# Altium footprint library 二极管封装库.PcbLib: 222 footprints (part 11 of 14)
Each footprint in its own frame and in the unit in brackets; x right, y up, seen from the top. Pads: shape width x height; smd on the part's side, far side on the other; paste and mask are expansions set on the pad; w line width, h text height; cw(c..) or ccw(c..) is an arc to the next point about the centre after c.
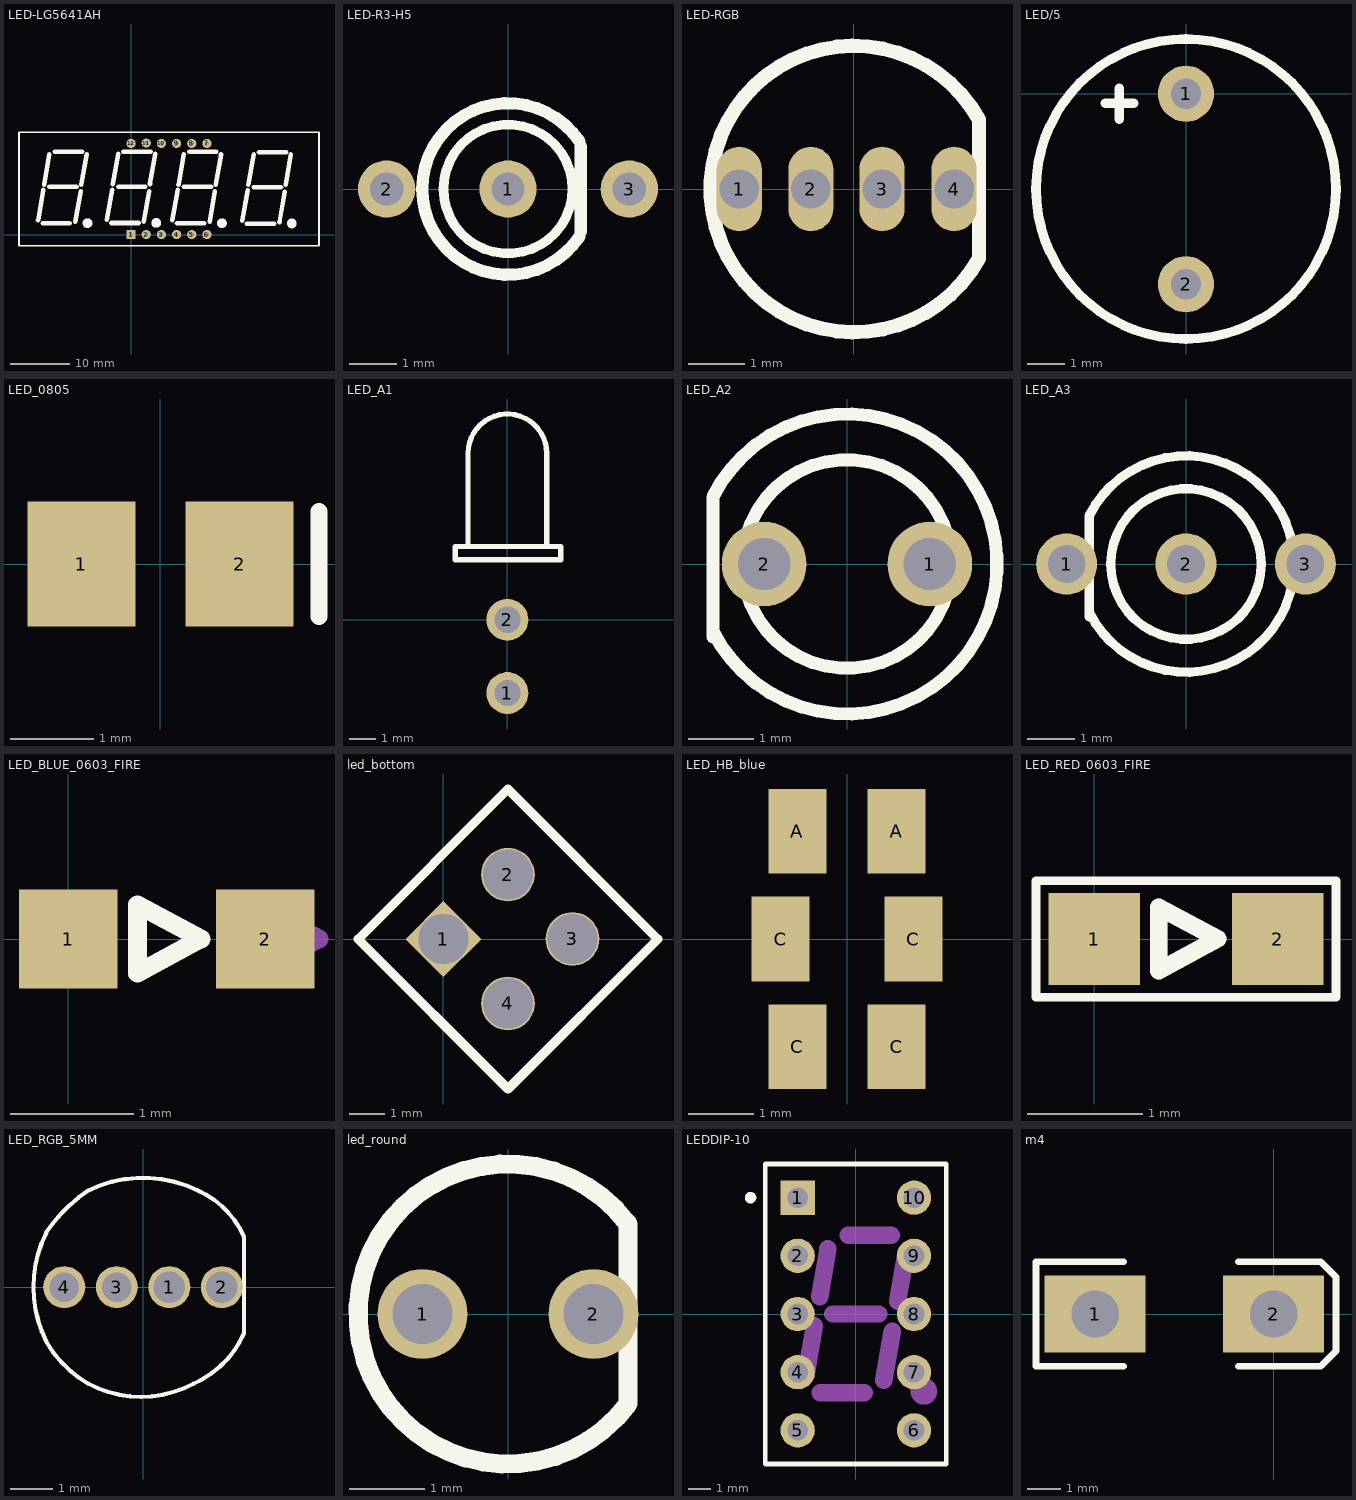
[diagram p10: the footprints below, top view; thin cyan lines are the x and y axes]

## LED-LG5641AH [mm]
pads (12):
  rect 1.54x1.54 hole 0.7: 1(0,0)
  round 1.54 hole 0.7: 2(2.54,0) 3(5.08,0) 4(7.62,0) 5(10.16,0) 6(12.7,0) 7(12.7,15.24) 8(10.16,15.24) 9(7.62,15.24) 10(5.08,15.24) 11(2.54,15.312) 12(0,15.24)
Top Overlay:
  circle w1.016: c26.898,1.857 r0.305
  circle w1.016: c15.205,1.907 r0.305
  circle w1.016: c4.209,1.957 r0.305
  circle w1.016: c-7.286,1.907 r0.305
  lines w0.254: -18.75,-1.88 31.45,-1.88 31.45,17.12 -18.75,17.12 -18.75,-1.88
  lines w0.762: -15.566,2.39 -14.677,7.47 ; -14.804,1.882 -10.232,1.882 ; -14.55,8.359 -13.661,13.439 ; -13.661,7.978 -9.089,7.978 ; -12.772,13.82 -8.2,13.82 ; -9.343,2.136 -8.454,7.216 ; -8.327,8.359 -7.438,13.439 ; -4.071,2.44 -3.182,7.52 ; -3.309,1.932 1.263,1.932 ; -3.055,8.409 -2.166,13.489 ; -2.166,8.028 2.406,8.028 ; -1.277,13.87 3.295,13.87 ; 2.152,2.186 3.041,7.266 ; 3.168,8.409 4.057,13.489 ; 6.925,2.39 7.814,7.47 ; 7.687,1.882 12.259,1.882 ; 7.941,8.359 8.83,13.439 ; 8.83,7.978 13.402,7.978 ; 9.719,13.82 14.291,13.82 ; 13.148,2.136 14.037,7.216 ; 14.164,8.359 15.053,13.439 ; 18.618,2.34 19.507,7.42 ; 19.38,1.832 23.952,1.832 ; 19.634,8.309 20.523,13.389 ; 20.523,7.928 25.095,7.928 ; 21.412,13.77 25.984,13.77 ; 24.841,2.086 25.73,7.166 ; 25.857,8.309 26.746,13.389

## LED-R3-H5 [mm]
height 5
pads (3):
  round 1.2 hole 0.7: 1(0,0) 2(-2.54,0) 3(2.54,0)
Top Overlay:
  circle w0.2: c0,0 r1.35
  lines w0.254: 1.494,-0.996 cw(c0,0) 1.494,0.996 ; 1.524,-0.889 1.524,0.889
3D body "LED-DBL.STEP": height 5.7, standoff -2.3, extent -2.79,-2.035 2.79,2.035

## LED-RGB [mm] "三基色二极管"
height 6
pads (4):
  oval 0.8x1.5 hole 0.7: 1(-2.032,0) 2(-0.762,0) 3(0.5,0) 4(1.778,0)
Top Overlay:
  lines w0.254: 2.22,-1.234 cw(c0,0) 2.22,1.234 2.22,-1.234

## LED/5 [mm]
pads (2):
  round 1.5 hole 0.8: 1(0,0) 2(0,-5.08)
Top Overlay:
  circle w0.254: c0,-2.54 r4
  lines w0.254: -2.159,-0.254 -1.397,-0.254 ; -1.778,-0.686 -1.778,0.152

## LED_0805 [mm] "贴片二极管"
height 1.1
pads (2):
  rect 1.3x1.5 smd: 1(-0.95,0) 2(0.95,0)
Top Overlay:
  lines w0.2: 1.905,-0.635 1.905,0.635

## LED_A1 [mm] "直径3MM二极管"
height 3.5
pads (2):
  round 1.6 hole 1: 1(0,-2.794) 2(0,0)
Top Overlay:
  lines w0.2: -1.5,2.852 -1.5,6.35 cw(c0,6.35) 1.5,6.35 1.5,2.852 ; -1.984,2.286 -1.984,2.794 2.032,2.794 2.032,2.286 -1.984,2.286

## LED_A2 [mm] "直径3MM二极管"
height 5.5
pads (2):
  round 1.3 hole 0.8: 1(1.27,0) 2(-1.27,0)
Top Overlay:
  circle w0.2: c0,0 r1.6
  lines w0.2: -2.057,-1.118 -2.057,1.029 cw(c0,0) -2.057,-1.029

## LED_A3 [mm] "直径3MM二极管"
height 5.5
pads (3):
  round 1.3 hole 0.8: 1(-2.54,0) 2(0,0) 3(2.54,0)
Top Overlay:
  circle w0.2: c0,0 r1.6
  lines w0.2: -2.057,-1.118 -2.057,1.029 cw(c0,0) -2.057,-1.029
3D body "User Library-5BC-3-CA-F.STEP": height 11.9, standoff -2.71, extent -2.786,-2.9 2.9,2.9

## LED_BLUE_0603_FIRE [mm]
pads (2):
  rect 0.8x0.8 smd: 1(0,0) 2(1.6,0)
Top Overlay:
  lines w0.152: 0.562,-0.277 0.562,0.277 1.076,0.001 0.562,-0.277
Mechanical 1:
  lines w0.152: 1.521,-0.277 1.521,0.277 2.035,0.001 1.521,-0.277

## led_bottom [mm]
pads (4):
  rect 1.5x1.5 hole 1.4 rot 45: 1(0,0)
  round 1.5 hole 1.4: 2(1.801,1.801) 3(3.605,0.002) 4(1.801,-1.801)
Top Overlay:
  lines w0.254: 1.801,4.189 -2.388,0 1.803,-4.191 5.994,0 1.801,4.193

## LED_HB_blue [mil] "LED High Brightness for blue"
pads (6):
  rect 35x51 smd: A(-30,65) A(30,65) C(-40,0) C(-30,-65) C(30,-65) C(40,0)
3D body "User Library-LED_ASMT-QTB0-0AA02.STEP": height 76.77, standoff -1.97, extent -67.32,-69.29 66.54,72.44

## LED_RED_0603_FIRE [mm]
pads (2):
  rect 0.8x0.8 smd: 1(0,0) 2(1.6,0)
Top Overlay:
  lines w0.076: -0.508,-0.508 2.108,-0.508 2.108,0.508 -0.508,0.508 -0.508,-0.508
  lines w0.152: 0.562,-0.277 1.076,0.001 0.562,0.277 0.562,-0.277
Mechanical 1:
  lines w0.152: 0.562,-0.277 1.076,0.001 0.562,0.277 0.562,-0.277

## LED_RGB_5MM [mm]
pads (4):
  round 1 hole 0.75: 1(0.625,0) 2(1.875,0)
  round 1 hole 0.7: 3(-0.625,0) 4(-1.875,0)
Top Overlay:
  lines w0.1: -2.301,1.297 ccw(c0.3,0) -2.299,-1.302 ; -2.299,-1.301 ccw(c0.05,0.05) -1.301,-2.299 ; -2.299,1.302 cw(c0.65,-0.65) -1.297,2.302 ; -1.3,-2.3 ccw(c-0.05,0.05) 1.2,-2.3 ; -1.299,2.301 cw(c0,-0.35) 1.303,2.298 ; 1.202,-2.299 ccw(c0.25,-0.15) 2.401,-1.099 ; 1.302,2.299 cw(c0.45,0.35) 2.401,1.198 ; 2.4,-1.1 2.4,1.2
  text "D3" at 0.228,-0.214 h0.38

## led_round [mm]
pads (2):
  round 1.2 hole 0.8: 1(-1.14,0) 2(1.14,0)
Top Overlay:
  lines w0.254: 1.591,1.212 ccw(c0,0) 1.603,-1.196 1.603,1.2

## LEDDIP-10 [mm] "LED, 7-Segment Display, 7.62 mm, RHD; 10 Leads; Row Space 5.08 mm; Pitch 2.54 mm"
height 6.34
pads (10):
  rect 1.5x1.5 hole 0.9: 1(-2.54,5.08)
  round 1.5 hole 0.9: 2(-2.54,2.54) 3(-2.54,0) 4(-2.54,-2.54) 5(-2.54,-5.08) 6(2.54,-5.08) 7(2.54,-2.54) 8(2.54,0) 9(2.54,2.54) 10(2.54,5.08)
Top Overlay:
  circle w0.25: c-4.6,5.08 r0.125
  lines w0.2: -3.95,-6.55 -3.95,6.55 3.95,6.55 3.95,-6.55 -3.95,-6.55
Mechanical 1:
  circle w0.86: c2.97,-3.38 r0.15
  lines w0.762: -2.19,-2.69 -1.81,-0.52 ; -1.58,0.76 -1.22,2.84 ; -1.56,-3.43 0.36,-3.43 ; -1.004,0 1.004,0 ; -0.34,3.43 1.55,3.43 ; 1.22,-2.89 1.59,-0.76 ; 1.82,0.56 2.2,2.69
3D body "LEDDIP-10.STEP": height 6, standoff 0, extent -4.025,-6.447 3.975,6.553

## m4 [mm]
height 3
pads (2):
  rect 3x2.3 on Top hole 1.4: 1(-5.3,0) 2(0,0)
Top Overlay:
  lines w0.2: -4.458,-1.55 -7.058,-1.55 -7.058,1.55 -4.458,1.55 ; -1.05,-1.55 1.4,-1.55 1.85,-1.1 1.85,1.1 1.4,1.55 -1.05,1.55